# Altium footprint library devices.PCBLIB: 335 footprints (part 12 of 21)
Each footprint in its own frame and in the unit in brackets; x right, y up, seen from the top. Pads: shape width x height; smd on the part's side, far side on the other; paste and mask are expansions set on the pad; w line width, h text height; cw(c..) or ccw(c..) is an arc to the next point about the centre after c.
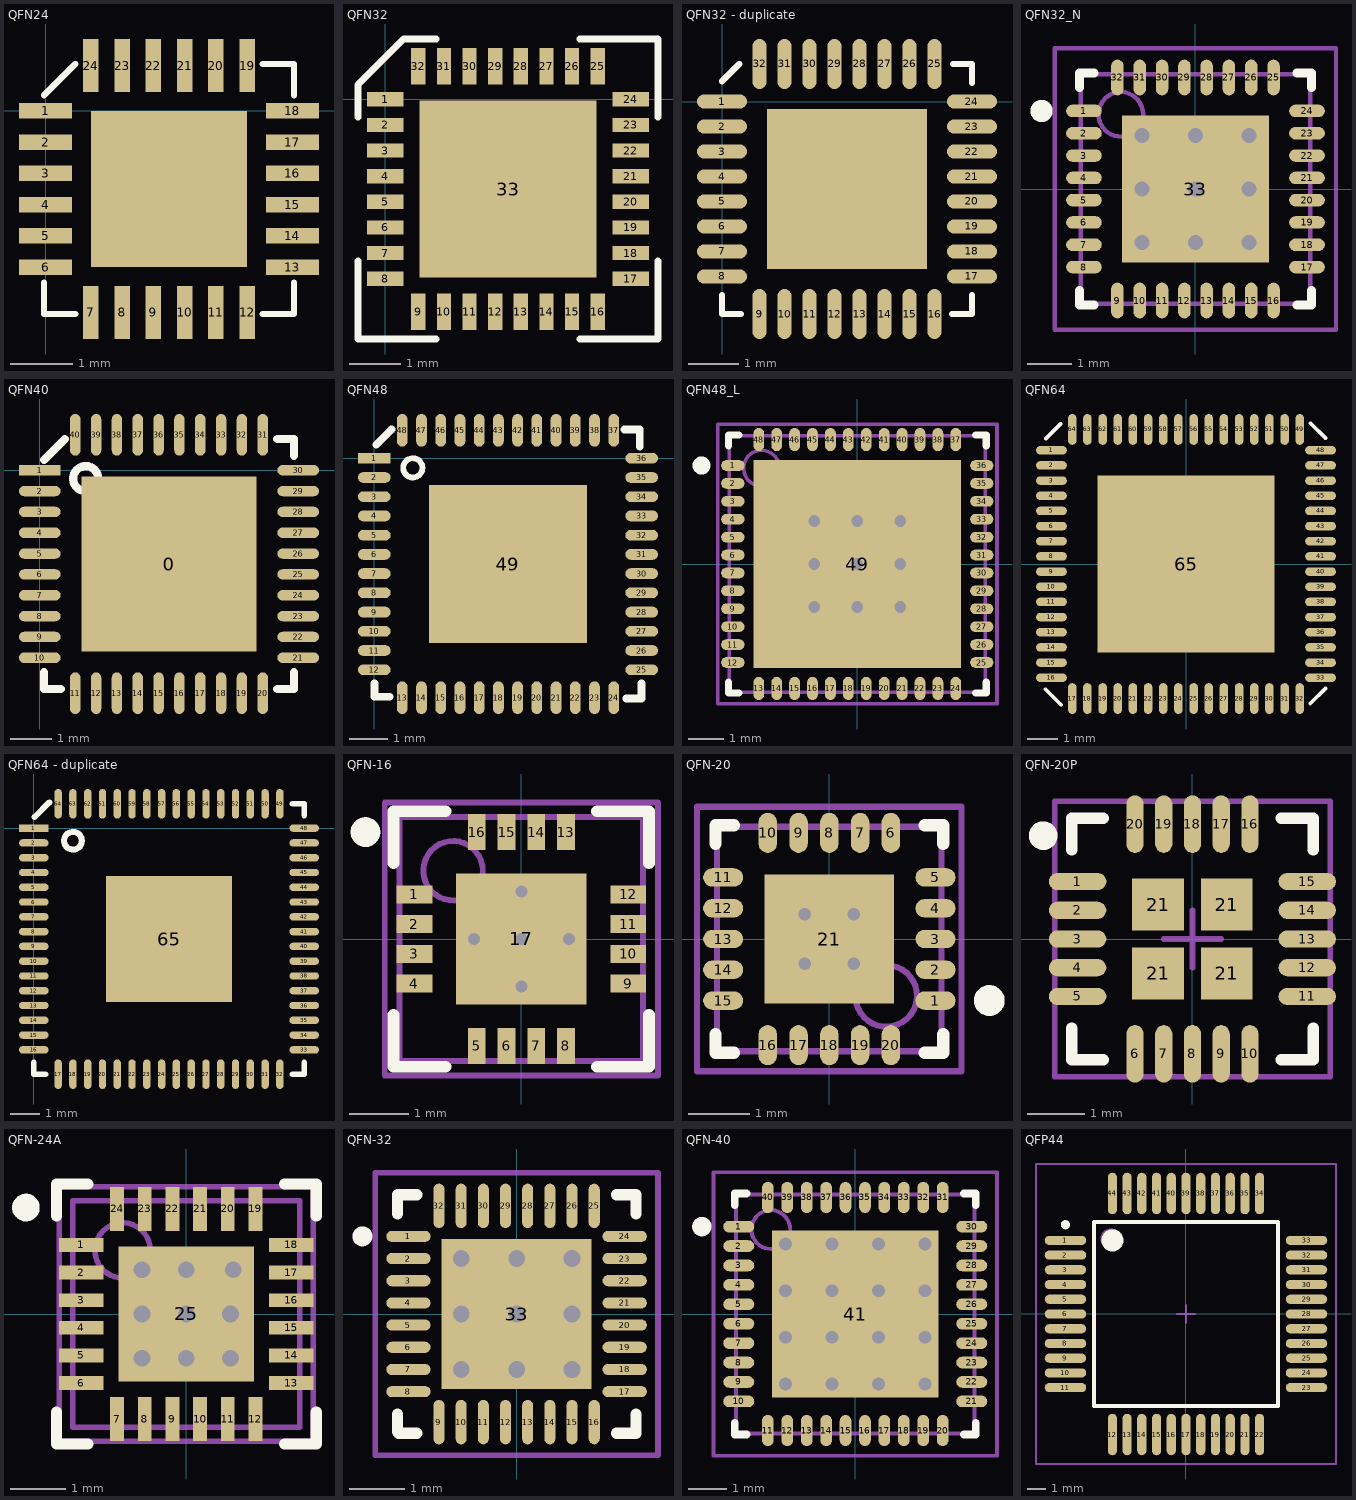
[diagram p11: the footprints below, top view; thin cyan lines are the x and y axes]

## QFN24 [mm]
pads (25):
  rect 0.85x0.25 smd: 1(0,0) 2(0,-0.5) 3(0,-1) 4(0,-1.5) 5(0,-2) 6(0,-2.5) 13(3.95,-2.5) 14(3.95,-2) 15(3.95,-1.5) 16(3.95,-1) 17(3.95,-0.5) 18(3.95,0)
  rect 0.25x0.85 smd: 7(0.725,-3.225) 8(1.225,-3.225) 9(1.725,-3.225) 10(2.225,-3.225) 11(2.725,-3.225) 12(3.225,-3.225) 19(3.225,0.725) 20(2.725,0.725) 21(2.225,0.725) 22(1.725,0.725) 23(1.225,0.725) 24(0.725,0.725)
  rect 2.5x2.5 smd: ""(1.975,-1.25)
Top Overlay:
  lines w0.1: -0.025,-2.75 -0.025,-3.25 0.475,-3.25 ; -0.025,0.25 0.475,0.75 ; 3.475,-3.25 3.975,-3.25 3.975,-2.75 ; 3.475,0.75 3.975,0.75 3.975,0.25

## QFN32 [mil]
pads (33):
  rect 28x11 smd: 1(0,0) 2(0,-19.7) 3(0,-39.4) 4(0,-59.1) 5(0,-78.8) 6(0,-98.5) 7(0,-118.2) 8(0,-137.9) 17(189,-137.9) 18(189,-118.2) 19(189,-98.5) 20(189,-78.8) 21(189,-59.1) 22(189,-39.4) 23(189,-19.7) 24(189,0)
  rect 11x28 smd: 9(25.55,-163.45) 10(45.25,-163.45) 11(64.95,-163.45) 12(84.65,-163.45) 13(104.35,-163.45) 14(124.05,-163.45) 15(143.75,-163.45) 16(163.45,-163.45) 25(163.45,25.55) 26(143.75,25.55) 27(124.05,25.55) 28(104.35,25.55) 29(84.65,25.55) 30(64.95,25.55) 31(45.25,25.55) 32(25.55,25.55)
  rect 136x136 smd: 33(94.5,-68.95)
Top Overlay:
  lines w5: -20.86,-124.31 -20.86,-184.31 39.14,-184.31 ; -20.86,-13.59 -20.86,11.41 14.14,46.41 39.14,46.41 ; 149.86,-184.31 209.86,-184.31 209.86,-124.31 ; 149.86,46.41 209.86,46.41 209.86,-13.59
Top Paste:
  lines w1: 31.5,-131.95 89.5,-131.95 89.5,-73.95 31.5,-73.95 31.5,-131.95 ; 31.5,-63.95 89.5,-63.95 89.5,-5.95 31.5,-5.95 31.5,-63.95 ; 99.5,-131.95 157.5,-131.95 157.5,-73.95 99.5,-73.95 99.5,-131.95 ; 99.5,-63.95 157.5,-63.95 157.5,-5.95 99.5,-5.95 99.5,-63.95

## QFN32 - duplicate [mm]
pads (33):
  oval 1x0.28 smd: 1(0,0) 2(0,-0.5) 3(0,-1) 4(0,-1.5) 5(0,-2) 6(0,-2.5) 7(0,-3) 8(0,-3.5) 17(5,-3.5) 18(5,-3) 19(5,-2.5) 20(5,-2) 21(5,-1.5) 22(5,-1) 23(5,-0.5) 24(5,0)
  oval 0.28x1 smd: 9(0.75,-4.25) 10(1.25,-4.25) 11(1.75,-4.25) 12(2.25,-4.25) 13(2.75,-4.25) 14(3.25,-4.25) 15(3.75,-4.25) 16(4.25,-4.25) 25(4.25,0.75) 26(3.75,0.75) 27(3.25,0.75) 28(2.75,0.75) 29(2.25,0.75) 30(1.75,0.75) 31(1.25,0.75) 32(0.75,0.75)
  rect 3.2x3.2 smd: ""(2.5,-1.75)
Top Overlay:
  lines w0.127: 0,-3.869 0,-4.25 0.381,-4.25 ; 0,0.404 0.346,0.75 ; 4.6,-4.25 5,-4.25 5,-3.869 ; 4.619,0.75 5,0.75 5,0.369

## QFN32_N [mm] "QFN, 32-Leads, Body 5x5mm, Pitch 0.5mm, IPC Medium Density"
height 0.8
pads (33):
  oval 0.8x0.28 smd: 1(-2.5,1.75) 2(-2.5,1.25) 3(-2.5,0.75) 4(-2.5,0.25) 5(-2.5,-0.25) 6(-2.5,-0.75) 7(-2.5,-1.25) 8(-2.5,-1.75) 17(2.5,-1.75) 18(2.5,-1.25) 19(2.5,-0.75) 20(2.5,-0.25) 21(2.5,0.25) 22(2.5,0.75) 23(2.5,1.25) 24(2.5,1.75)
  oval 0.28x0.8 smd: 9(-1.75,-2.5) 10(-1.25,-2.5) 11(-0.75,-2.5) 12(-0.25,-2.5) 13(0.25,-2.5) 14(0.75,-2.5) 15(1.25,-2.5) 16(1.75,-2.5) 25(1.75,2.5) 26(1.25,2.5) 27(0.75,2.5) 28(0.25,2.5) 29(-0.25,2.5) 30(-0.75,2.5) 31(-1.25,2.5) 32(-1.75,2.5)
  rect 3.3x3.3 smd: 33(0,0)
via 1.2,-1.2 diameter 0.66 hole 0.33
via 0,-1.2 diameter 0.66 hole 0.33
via -1.2,-1.2 diameter 0.66 hole 0.33
via 1.2,0 diameter 0.66 hole 0.33
via 0,0 diameter 0.66 hole 0.33
via -1.2,0 diameter 0.66 hole 0.33
via 1.2,1.2 diameter 0.66 hole 0.33
via 0,1.2 diameter 0.66 hole 0.33
via -1.2,1.2 diameter 0.66 hole 0.33
Top Overlay:
  circle w0.25: c-3.45,1.75 r0.125
  lines w0.2: -2.6,-2.275 -2.6,-2.6 -2.275,-2.6 ; -2.6,2.275 -2.6,2.6 -2.275,2.6 ; 2.275,-2.6 2.6,-2.6 2.6,-2.275 ; 2.275,2.6 2.6,2.6 2.6,2.275
Mechanical 13:
  circle w0.1: c-1.675,1.675 r0.5
  lines w0.1: -2.575,-2.575 2.575,-2.575 2.575,2.575 -2.575,2.575 -2.575,-2.575
Mechanical 15:
  lines w0.1: -0.5,0 0.5,0 ; 0,-0.5 0,0.5 ; -3.15,-3.15 3.15,-3.15 3.15,3.15 -3.15,3.15 -3.15,-3.15
3D body: height 0.8, standoff 0, extent -2.575,-2.575 2.575,2.575

## QFN40 [mm]
pads (41):
  rect 4.2x4.2 smd: 0(3.1,-2.25)
  rect 1x0.25 smd: 1(0,0)
  oval 1x0.25 smd: 2(0,-0.5) 3(0,-1) 4(0,-1.5) 5(0,-2) 6(0,-2.5) 7(0,-3) 8(0,-3.5) 9(0,-4) 10(0,-4.5) 21(6.2,-4.5) 22(6.2,-4) 23(6.2,-3.5) 24(6.2,-3) 25(6.2,-2.5) 26(6.2,-2) 27(6.2,-1.5) 28(6.2,-1) 29(6.2,-0.5) 30(6.2,0)
  oval 0.25x1 smd: 11(0.85,-5.35) 12(1.35,-5.35) 13(1.85,-5.35) 14(2.35,-5.35) 15(2.85,-5.35) 16(3.35,-5.35) 17(3.85,-5.35) 18(4.35,-5.35) 19(4.85,-5.35) 20(5.35,-5.35) 31(5.35,0.85) 32(4.85,0.85) 33(4.35,0.85) 34(3.85,0.85) 35(3.35,0.85) 36(2.85,0.85) 37(2.35,0.85) 38(1.85,0.85) 39(1.35,0.85) 40(0.85,0.85)
Top Overlay:
  circle w0.2: c1.1,-0.2 r0.3
  lines w0.2: 0.1,-4.85 0.1,-5.25 0.5,-5.25 ; 0.1,0.25 0.6,0.75 ; 5.7,-5.25 6.1,-5.25 6.1,-4.85 ; 5.7,0.75 6.1,0.75 6.1,0.35

## QFN48 [mm]
pads (75):
  rect 0x0 / inner round 0 / far side round 0 all layers, no hole: 1(-0.075,0) 2(-0.075,-0.5) 3(-0.075,-1) 4(-0.075,-1.5) 5(-0.075,-2) 6(-0.075,-2.5) 7(-0.075,-3) 8(-0.075,-3.5) 9(-0.075,-4) 10(-0.075,-4.5) 14(1.215,-6.29) 15(1.715,-6.29) 17(2.715,-6.29) 18(3.215,-6.29) 19(3.715,-6.29) 20(4.215,-6.29) 21(4.715,-6.29) 22(5.215,-6.29) 23(5.715,-6.29) 24(6.215,-6.29) 25(7.005,-5.5) 26(7.005,-5)
  rect 0.85x0.28 smd: 1(0,0)
  oval 0.85x0.28 smd: 2(0,-0.5) 3(0,-1) 4(0,-1.5) 5(0,-2) 6(0,-2.5) 7(0,-3) 8(0,-3.5) 9(0,-4) 10(0,-4.5) 11(0,-5) 12(0,-5.5) 25(6.95,-5.5) 26(6.95,-5) 27(6.95,-4.5) 28(6.95,-4) 29(6.95,-3.5) 30(6.95,-3) 31(6.95,-2.5) 32(6.95,-2) 33(6.95,-1.5) 34(6.95,-1) 35(6.95,-0.5) 36(6.95,0)
  round 0 all layers, no hole: 11(-0.075,-5) 12(-0.075,-5.5) 13(0.715,-6.29) 16(2.215,-6.29)
  oval 0.28x0.85 smd: 13(0.725,-6.225) 14(1.225,-6.225) 15(1.725,-6.225) 16(2.225,-6.225) 17(2.725,-6.225) 18(3.225,-6.225) 19(3.725,-6.225) 20(4.225,-6.225) 21(4.725,-6.225) 22(5.225,-6.225) 23(5.725,-6.225) 24(6.225,-6.225) 37(6.225,0.725) 38(5.725,0.725) 39(5.225,0.725) 40(4.725,0.725) 41(4.225,0.725) 42(3.725,0.725) 43(3.225,0.725) 44(2.725,0.725) 45(2.225,0.725) 46(1.725,0.725) 47(1.225,0.725) 48(0.725,0.725)
  rect 4.1x4.1 smd: 49(3.475,-2.75)
Top Overlay:
  circle w0.15: c1,-0.25 r0.25
  lines w0.203: 0,-5.85 0,-6.2 0.4,-6.2 ; 0.05,0.35 0.45,0.75 ; 6.5,0.75 6.9,0.75 6.9,0.3 ; 6.55,-6.25 6.95,-6.25 6.95,-5.85

## QFN48_L [mm] "QFN, 48-Leads, Body 7x7mm, Pitch 0.5mm, IPC High Density"
height 0.9
pads (49):
  oval 0.65x0.3 smd: 1(-3.475,2.75) 2(-3.475,2.25) 3(-3.475,1.75) 4(-3.475,1.25) 5(-3.475,0.75) 6(-3.475,0.25) 7(-3.475,-0.25) 8(-3.475,-0.75) 9(-3.475,-1.25) 10(-3.475,-1.75) 11(-3.475,-2.25) 12(-3.475,-2.75) 25(3.475,-2.75) 26(3.475,-2.25) 27(3.475,-1.75) 28(3.475,-1.25) 29(3.475,-0.75) 30(3.475,-0.25) 31(3.475,0.25) 32(3.475,0.75) 33(3.475,1.25) 34(3.475,1.75) 35(3.475,2.25) 36(3.475,2.75)
  oval 0.3x0.65 smd: 13(-2.75,-3.475) 14(-2.25,-3.475) 15(-1.75,-3.475) 16(-1.25,-3.475) 17(-0.75,-3.475) 18(-0.25,-3.475) 19(0.25,-3.475) 20(0.75,-3.475) 21(1.25,-3.475) 22(1.75,-3.475) 23(2.25,-3.475) 24(2.75,-3.475) 37(2.75,3.475) 38(2.25,3.475) 39(1.75,3.475) 40(1.25,3.475) 41(0.75,3.475) 42(0.25,3.475) 43(-0.25,3.475) 44(-0.75,3.475) 45(-1.25,3.475) 46(-1.75,3.475) 47(-2.25,3.475) 48(-2.75,3.475)
  rect 5.8x5.8 smd: 49(0,0)
via -1.2,1.2 diameter 0.66 hole 0.33
via 0,1.2 diameter 0.66 hole 0.33
via 1.2,1.2 diameter 0.66 hole 0.33
via -1.2,0 diameter 0.66 hole 0.33
via 0,0 diameter 0.66 hole 0.33
via 1.2,0 diameter 0.66 hole 0.33
via -1.2,-1.2 diameter 0.66 hole 0.33
via 0,-1.2 diameter 0.66 hole 0.33
via 1.2,-1.2 diameter 0.66 hole 0.33
Top Overlay:
  circle w0.25: c-4.35,2.75 r0.125
  lines w0.2: -3.6,-3.3 -3.6,-3.6 -3.3,-3.6 ; -3.6,3.3 -3.6,3.6 -3.3,3.6 ; 3.3,-3.6 3.6,-3.6 3.6,-3.3 ; 3.3,3.6 3.6,3.6 3.6,3.3
Mechanical 13:
  circle w0.1: c-2.675,2.675 r0.5
  lines w0.1: -3.575,-3.575 -3.575,3.575 3.575,3.575 3.575,-3.575 -3.575,-3.575
Mechanical 15:
  lines w0.1: -0.5,0 0.5,0 ; 0,-0.5 0,0.5 ; -3.9,-3.9 -3.9,3.9 3.9,3.9 3.9,-3.9 -3.9,-3.9
3D body: height 0.9, standoff 0, extent -3.575,-3.575 3.575,3.575

## QFN64 [mil]
pads (65):
  oval 40x11 smd: 1(-174.72,147.64) 2(-174.72,127.95) 3(-174.72,108.27) 4(-174.72,88.58) 5(-174.72,68.9) 6(-174.72,49.21) 7(-174.72,29.53) 8(-174.72,9.84) 9(-174.72,-9.84) 10(-174.72,-29.53) 11(-174.72,-49.21) 12(-174.72,-68.9) 13(-174.72,-88.58) 14(-174.72,-108.27) 15(-174.72,-127.95) 16(-174.72,-147.64) 33(174.72,-147.64) 34(174.72,-127.95) 35(174.72,-108.27) 36(174.72,-88.58) 37(174.72,-68.9) 38(174.72,-49.21) 39(174.72,-29.53) 40(174.72,-9.84) 41(174.72,9.84) 42(174.72,29.53) 43(174.72,49.21) 44(174.72,68.9) 45(174.72,88.58) 46(174.72,108.27) 47(174.72,127.95) 48(174.72,147.64)
  oval 11x40 smd: 17(-147.64,-174.72) 18(-127.95,-174.72) 19(-108.27,-174.72) 20(-88.58,-174.72) 21(-68.9,-174.72) 22(-49.21,-174.72) 23(-29.53,-174.72) 24(-9.84,-174.72) 25(9.84,-174.72) 26(29.53,-174.72) 27(49.21,-174.72) 28(68.9,-174.72) 29(88.58,-174.72) 30(108.27,-174.72) 31(127.95,-174.72) 32(147.64,-174.72) 49(147.64,174.72) 50(127.95,174.72) 51(108.27,174.72) 52(88.58,174.72) 53(68.9,174.72) 54(49.21,174.72) 55(29.53,174.72) 56(9.84,174.72) 57(-9.84,174.72) 58(-29.53,174.72) 59(-49.21,174.72) 60(-68.9,174.72) 61(-88.58,174.72) 62(-108.27,174.72) 63(-127.95,174.72) 64(-147.64,174.72)
  rect 230x230 smd: 65(0,0)
Top Overlay:
  lines w5: -182.28,-162.6 -162.2,-182.68 ; -181.89,162.99 -162.99,181.89 ; 161.22,-181.3 181.1,-161.42 ; 161.81,182.68 180.91,163.58
Top Paste:
  pour cut-out: -106.69,107.87 -106.69,6.3 -14.17,6.3 -14.17,107.87
  pour cut-out: 13.78,107.87 13.78,6.3 106.3,6.3 106.3,107.87
  pour cut-out: 14.17,-5.91 14.17,-107.48 106.69,-107.48 106.69,-5.91
  pour cut-out: -106.69,-5.91 -106.69,-107.48 -14.17,-107.48 -14.17,-5.91

## QFN64 - duplicate [mm]
pads (65):
  rect 1x0.25 smd: 1(0,0)
  oval 1x0.25 smd: 2(0,-0.5) 3(0,-1) 4(0,-1.5) 5(0,-2) 6(0,-2.5) 7(0,-3) 8(0,-3.5) 9(0,-4) 10(0,-4.5) 11(0,-5) 12(0,-5.5) 13(0,-6) 14(0,-6.5) 15(0,-7) 16(0,-7.5) 33(9.15,-7.5) 34(9.15,-7) 35(9.15,-6.5) 36(9.15,-6) 37(9.15,-5.5) 38(9.15,-5) 39(9.15,-4.5) 40(9.15,-4) 41(9.15,-3.5) 42(9.15,-3) 43(9.15,-2.5) 44(9.15,-2) 45(9.15,-1.5) 46(9.15,-1) 47(9.15,-0.5) 48(9.15,0)
  oval 0.25x1 smd: 17(0.825,-8.325) 18(1.325,-8.325) 19(1.825,-8.325) 20(2.325,-8.325) 21(2.825,-8.325) 22(3.325,-8.325) 23(3.825,-8.325) 24(4.325,-8.325) 25(4.825,-8.325) 26(5.325,-8.325) 27(5.825,-8.325) 28(6.325,-8.325) 29(6.825,-8.325) 30(7.325,-8.325) 31(7.825,-8.325) 32(8.325,-8.325) 49(8.325,0.825) 50(7.825,0.825) 51(7.325,0.825) 52(6.825,0.825) 53(6.325,0.825) 54(5.825,0.825) 55(5.325,0.825) 56(4.825,0.825) 57(4.325,0.825) 58(3.825,0.825) 59(3.325,0.825) 60(2.825,0.825) 61(2.325,0.825) 62(1.825,0.825) 63(1.325,0.825) 64(0.825,0.825)
  rect 4.25x4.25 smd: 65(4.575,-3.75)
Top Overlay:
  circle w0.2: c1.325,-0.425 r0.3
  lines w0.2: 0,-7.925 0,-8.325 0.4,-8.325 ; 8.75,-8.325 9.15,-8.325 9.15,-7.925 ; 8.75,0.825 9.15,0.825 9.15,0.425
  lines w0.203: 0.025,0.375 0.525,0.875

## QFN-16 [mm] "QFN, 16-Leads, Body 4x4mm, Pitch 0.5mm, NSC Recommended"
height 0.8
pads (17):
  rect 0.6x0.3 smd paste-0.125 mask+0.051: 1(-1.8,0.75) 2(-1.8,0.25) 3(-1.8,-0.25) 4(-1.8,-0.75) 9(1.8,-0.75) 10(1.8,-0.25) 11(1.8,0.25) 12(1.8,0.75)
  rect 0.3x0.6 smd paste-0.125 mask+0.051: 5(-0.75,-1.8) 6(-0.25,-1.8) 7(0.25,-1.8) 8(0.75,-1.8) 13(0.75,1.8) 14(0.25,1.8) 15(-0.25,1.8) 16(-0.75,1.8)
  rect 2.2x2.2 smd paste-1.3 mask+0.051: 17(0,0)
via 0,-0.8 diameter 0.5 hole 0.2
via 0,0.8 diameter 0.5 hole 0.2
via -0.8,0 diameter 0.5 hole 0.2
via 0.8,0 diameter 0.5 hole 0.2
via 0,0 diameter 0.5 hole 0.2
Top Overlay:
  circle w0.25: c-2.625,1.8 r0.125
  lines w0.2: -2.15,-1.275 -2.15,-2.15 -1.275,-2.15 ; -2.15,1.275 -2.15,2.15 -1.275,2.15 ; 1.275,-2.15 2.15,-2.15 2.15,-1.275 ; 1.275,2.15 2.15,2.15 2.15,1.275
Top Paste:
  rectangle: 0.1,-1.2 1.2,-0.1
  region: -0.1,-0.1 -1.2,-0.1 -1.2,-1.2 -0.1,-1.2
  region: -0.1,1.2 -1.2,1.2 -1.2,0.1 -0.1,0.1
  rectangle: 0.1,0.1 1.2,1.2
  rectangle: -2.3,0.625 -1.6,0.875
  rectangle: -2.3,0.125 -1.6,0.375
  rectangle: -2.3,-0.375 -1.6,-0.125
  rectangle: -2.3,-0.875 -1.6,-0.625
  region: 2.3,0.875 1.6,0.875 1.6,0.625 2.3,0.625
  region: 2.3,0.375 1.6,0.375 1.6,0.125 2.3,0.125
  region: 2.3,-0.125 1.6,-0.125 1.6,-0.375 2.3,-0.375
  region: 2.3,-0.625 1.6,-0.625 1.6,-0.875 2.3,-0.875
  region: -0.875,2.3 -0.875,1.6 -0.625,1.6 -0.625,2.3
  region: -0.375,2.3 -0.375,1.6 -0.125,1.6 -0.125,2.3
  region: 0.125,2.3 0.125,1.6 0.375,1.6 0.375,2.3
  region: 0.625,2.3 0.625,1.6 0.875,1.6 0.875,2.3
  region: 0.875,-2.3 0.875,-1.6 0.625,-1.6 0.625,-2.3
  region: 0.375,-2.3 0.375,-1.6 0.125,-1.6 0.125,-2.3
  region: -0.125,-2.3 -0.125,-1.6 -0.375,-1.6 -0.375,-2.3
  region: -0.625,-2.3 -0.625,-1.6 -0.875,-1.6 -0.875,-2.3
Mechanical 13:
  circle w0.1: c-1.15,1.15 r0.5
  lines w0.1: -2.05,-2.05 -2.05,2.05 2.05,2.05 2.05,-2.05 -2.05,-2.05
Mechanical 15:
  lines w0.1: -0.5,0 0.5,0 ; 0,-0.5 0,0.5 ; -2.3,-2.3 -2.3,2.3 2.3,2.3 2.3,-2.3 -2.3,-2.3
3D body: height 0.8, standoff 0, extent -2.05,-2.05 2.05,2.05

## QFN-20 [mm] "QFN, 20-Leads, Body 3.5x3.5mm, Pitch 0.5mm, IPC High Density"
height 1
pads (21):
  oval 0.65x0.3 smd: 1(1.725,-1) 2(1.725,-0.5) 3(1.725,0) 4(1.725,0.5) 5(1.725,1) 11(-1.725,1) 12(-1.725,0.5) 13(-1.725,0) 14(-1.725,-0.5) 15(-1.725,-1)
  oval 0.3x0.65 smd: 6(1,1.725) 7(0.5,1.725) 8(0,1.725) 9(-0.5,1.725) 10(-1,1.725) 16(-1,-1.725) 17(-0.5,-1.725) 18(0,-1.725) 19(0.5,-1.725) 20(1,-1.725)
  rect 2.1x2.1 smd: 21(0,0)
via -0.4,0.4 diameter 0.508 hole 0.203
via 0.4,0.4 diameter 0.508 hole 0.203
via -0.4,-0.4 diameter 0.508 hole 0.203
via 0.4,-0.4 diameter 0.508 hole 0.203
Top Overlay:
  circle w0.25: c2.6,-1 r0.125
  lines w0.2: -1.85,-1.55 -1.85,-1.85 -1.55,-1.85 ; -1.85,1.55 -1.85,1.85 -1.55,1.85 ; 1.55,-1.85 1.85,-1.85 1.85,-1.55 ; 1.55,1.85 1.85,1.85 1.85,1.55
Mechanical 13:
  circle w0.1: c0.925,-0.925 r0.5
  lines w0.1: -1.825,-1.825 1.825,-1.825 1.825,1.825 -1.825,1.825 -1.825,-1.825
Mechanical 15:
  lines w0.1: -0.5,0 0.5,0 ; 0,-0.5 0,0.5 ; -2.15,-2.15 2.15,-2.15 2.15,2.15 -2.15,2.15 -2.15,-2.15
3D body: height 1, standoff 0, extent -1.825,-1.825 1.825,1.825

## QFN-20P [mm]
height 1
pads (24):
  oval 1x0.3 smd: 1(-2,1) 2(-2,0.5) 3(-2,0) 4(-2,-0.5) 5(-2,-1) 11(2,-1) 12(2,-0.5) 13(2,0) 14(2,0.5) 15(2,1)
  oval 0.3x1 smd: 6(-1,-2) 7(-0.5,-2) 8(0,-2) 9(0.5,-2) 10(1,-2) 16(1,2) 17(0.5,2) 18(0,2) 19(-0.5,2) 20(-1,2)
  rect 0.9x0.9 smd: 21(-0.6,-0.6) 21(-0.6,0.6) 21(0.6,-0.6) 21(0.6,0.6)
Top Overlay:
  circle w0.25: c-2.6,1.8 r0.125
  lines w0.2: -2.1,-1.55 -2.1,-2.1 -1.55,-2.1 ; -2.1,1.55 -2.1,2.1 -1.55,2.1 ; 1.55,-2.1 2.1,-2.1 2.1,-1.55 ; 1.55,2.1 2.1,2.1 2.1,1.55
Mechanical 15:
  lines w0.1: -0.5,0 0.5,0 ; 0,-0.5 0,0.5 ; -2.4,-2.4 2.4,-2.4 2.4,2.4 -2.4,2.4 -2.4,-2.4

## QFN-24A [mm] "QFN, 24-Leads, Body 4x4mm, Pitch 0.5mm, NSC Recommended"
height 0.8
pads (25):
  rect 0.8x0.25 smd paste-0.125 mask+0.051: 1(-1.9,1.25) 2(-1.9,0.75) 3(-1.9,0.25) 4(-1.9,-0.25) 5(-1.9,-0.75) 6(-1.9,-1.25) 13(1.9,-1.25) 14(1.9,-0.75) 15(1.9,-0.25) 16(1.9,0.25) 17(1.9,0.75) 18(1.9,1.25)
  rect 0.25x0.8 smd paste-0.125 mask+0.051: 7(-1.25,-1.9) 8(-0.75,-1.9) 9(-0.25,-1.9) 10(0.25,-1.9) 11(0.75,-1.9) 12(1.25,-1.9) 19(1.25,1.9) 20(0.75,1.9) 21(0.25,1.9) 22(-0.25,1.9) 23(-0.75,1.9) 24(-1.25,1.9)
  rect 2.45x2.45 smd paste-1.3 mask+0.051: 25(0,0)
via -0.8,0.8 diameter 0.5 hole 0.3
via 0,0.8 diameter 0.5 hole 0.3
via 0.85,0.8 diameter 0.5 hole 0.3
via -0.8,0 diameter 0.5 hole 0.3
via 0,0 diameter 0.5 hole 0.3
via 0.8,0 diameter 0.5 hole 0.3
via -0.8,-0.8 diameter 0.5 hole 0.3
via 0,-0.8 diameter 0.5 hole 0.3
via 0.8,-0.8 diameter 0.5 hole 0.3
Top Overlay:
  circle w0.25: c-2.9,1.925 r0.125
  lines w0.2: -2.35,-1.775 -2.35,-2.35 -1.775,-2.35 ; -2.35,1.775 -2.35,2.35 -1.775,2.35 ; 1.775,-2.35 2.35,-2.35 2.35,-1.775 ; 1.775,2.35 2.35,2.35 2.35,1.775
Top Paste:
  rectangle: 0.1,0.1 1.2,1.2
  region: -0.1,1.2 -1.2,1.2 -1.2,0.1 -0.1,0.1
  region: -0.1,-0.1 -1.2,-0.1 -1.2,-1.2 -0.1,-1.2
  rectangle: 0.1,-1.2 1.2,-0.1
  rectangle: -2.4,1.125 -1.7,1.375
  rectangle: -2.4,0.625 -1.7,0.875
  rectangle: -2.4,0.125 -1.7,0.375
  rectangle: -2.4,-0.375 -1.7,-0.125
  rectangle: -2.4,-0.875 -1.7,-0.625
  rectangle: -2.4,-1.375 -1.7,-1.125
  region: 1.375,-2.4 1.375,-1.7 1.125,-1.7 1.125,-2.4
  region: 0.875,-2.4 0.875,-1.7 0.625,-1.7 0.625,-2.4
  region: 0.375,-2.4 0.375,-1.7 0.125,-1.7 0.125,-2.4
  region: -0.125,-2.4 -0.125,-1.7 -0.375,-1.7 -0.375,-2.4
  region: -0.625,-2.4 -0.625,-1.7 -0.875,-1.7 -0.875,-2.4
  region: -1.125,-2.4 -1.125,-1.7 -1.375,-1.7 -1.375,-2.4
  region: 2.4,1.375 1.7,1.375 1.7,1.125 2.4,1.125
  region: 2.4,0.875 1.7,0.875 1.7,0.625 2.4,0.625
  region: 2.4,0.375 1.7,0.375 1.7,0.125 2.4,0.125
  region: 2.4,-0.125 1.7,-0.125 1.7,-0.375 2.4,-0.375
  region: 2.4,-0.625 1.7,-0.625 1.7,-0.875 2.4,-0.875
  region: 2.4,-1.125 1.7,-1.125 1.7,-1.375 2.4,-1.375
  region: -1.375,2.4 -1.375,1.7 -1.125,1.7 -1.125,2.4
  region: -0.875,2.4 -0.875,1.7 -0.625,1.7 -0.625,2.4
  region: -0.375,2.4 -0.375,1.7 -0.125,1.7 -0.125,2.4
  region: 0.125,2.4 0.125,1.7 0.375,1.7 0.375,2.4
  region: 0.625,2.4 0.625,1.7 0.875,1.7 0.875,2.4
  region: 1.125,2.4 1.125,1.7 1.375,1.7 1.375,2.4
Mechanical 13:
  circle w0.1: c-1.15,1.15 r0.5
  lines w0.1: -2.05,-2.05 2.05,-2.05 2.05,2.05 -2.05,2.05 -2.05,-2.05
Mechanical 15:
  lines w0.1: -0.5,0 0.5,0 ; 0,-0.5 0,0.5 ; -2.3,-2.3 2.3,-2.3 2.3,2.3 -2.3,2.3 -2.3,-2.3
3D body: height 0.8, standoff 0, extent -2.05,-2.05 2.05,2.05

## QFN-32 [mm] "QFN, 32-Leads, Body 5x5mm, Pitch 0.5mm, IPC High Density"
height 1
pads (33):
  oval 0.8x0.2 smd: 1(-1.95,1.4) 2(-1.95,1) 3(-1.95,0.6) 4(-1.95,0.2) 5(-1.95,-0.2) 6(-1.95,-0.6) 7(-1.95,-1) 8(-1.95,-1.4) 17(1.95,-1.4) 18(1.95,-1) 19(1.95,-0.6) 20(1.95,-0.2) 21(1.95,0.2) 22(1.95,0.6) 23(1.95,1) 24(1.95,1.4)
  oval 0.2x0.8 smd: 9(-1.4,-1.95) 10(-1,-1.95) 11(-0.6,-1.95) 12(-0.2,-1.95) 13(0.2,-1.95) 14(0.6,-1.95) 15(1,-1.95) 16(1.4,-1.95) 25(1.4,1.95) 26(1,1.95) 27(0.6,1.95) 28(0.2,1.95) 29(-0.2,1.95) 30(-0.6,1.95) 31(-1,1.95) 32(-1.4,1.95)
  rect 2.7x2.7 smd: 33(0,0)
via 0,1 diameter 0.5 hole 0.3
via 1,1 diameter 0.5 hole 0.3
via -1,0 diameter 0.5 hole 0.3
via -1,-1 diameter 0.5 hole 0.3
via 1,0 diameter 0.5 hole 0.3
via 0,-1 diameter 0.5 hole 0.3
via 1,-1 diameter 0.5 hole 0.3
via -1,1 diameter 0.5 hole 0.3
via 0,0 diameter 0.5 hole 0.3
Top Overlay:
  circle w0.2: c-2.78,1.4 r0.08
  lines w0.2: -2.15,-2.125 -2.15,-1.8 ; -2.15,1.8 -2.15,2.15 ; -2.125,-2.15 -1.8,-2.15 ; -2.125,2.15 -1.8,2.15 ; 1.8,-2.15 2.15,-2.15 2.15,-1.8 ; 1.8,2.15 2.125,2.15 ; 2.15,1.8 2.15,2.15
Mechanical 15:
  lines w0.1: -0.15,-0.5 0.85,-0.5 ; 0.35,-1 0.35,0 ; -2.55,-2.55 2.55,-2.55 2.55,2.55 -2.55,2.55 -2.55,-2.55

## QFN-40 [mm] "QFN, 40-Leads, Body 6x6mm, Pitch 0.5mm, IPC Medium Density"
height 0.8
pads (41):
  oval 0.8x0.3 smd: 1(-3,2.25) 2(-3,1.75) 3(-3,1.25) 4(-3,0.75) 5(-3,0.25) 6(-3,-0.25) 7(-3,-0.75) 8(-3,-1.25) 9(-3,-1.75) 10(-3,-2.25) 21(3,-2.25) 22(3,-1.75) 23(3,-1.25) 24(3,-0.75) 25(3,-0.25) 26(3,0.25) 27(3,0.75) 28(3,1.25) 29(3,1.75) 30(3,2.25)
  oval 0.3x0.8 smd: 11(-2.25,-3) 12(-1.75,-3) 13(-1.25,-3) 14(-0.75,-3) 15(-0.25,-3) 16(0.25,-3) 17(0.75,-3) 18(1.25,-3) 19(1.75,-3) 20(2.25,-3) 31(2.25,3) 32(1.75,3) 33(1.25,3) 34(0.75,3) 35(0.25,3) 36(-0.25,3) 37(-0.75,3) 38(-1.25,3) 39(-1.75,3) 40(-2.25,3)
  rect 4.3x4.3 smd: 41(0,0)
via 1.8,-1.8 diameter 0.66 hole 0.33
via 0.6,-1.8 diameter 0.66 hole 0.33
via -0.6,-1.8 diameter 0.66 hole 0.33
via -1.8,-1.8 diameter 0.66 hole 0.33
via 1.8,-0.6 diameter 0.66 hole 0.33
via 0.6,-0.6 diameter 0.66 hole 0.33
via -0.6,-0.6 diameter 0.66 hole 0.33
via -1.8,-0.6 diameter 0.66 hole 0.33
via 1.8,0.6 diameter 0.66 hole 0.33
via 0.6,0.6 diameter 0.66 hole 0.33
via -0.6,0.6 diameter 0.66 hole 0.33
via -1.8,0.6 diameter 0.66 hole 0.33
via 1.8,1.8 diameter 0.66 hole 0.33
via 0.6,1.8 diameter 0.66 hole 0.33
via -0.6,1.8 diameter 0.66 hole 0.33
via -1.8,1.8 diameter 0.66 hole 0.33
Top Overlay:
  circle w0.25: c-3.95,2.25 r0.125
  lines w0.2: -3.1,-2.8 -3.1,-3.1 -2.8,-3.1 ; -3.1,2.8 -3.1,3.1 -2.8,3.1 ; 2.8,-3.1 3.1,-3.1 3.1,-2.8 ; 2.8,3.1 3.1,3.1 3.1,2.8
Mechanical 13:
  circle w0.1: c-2.175,2.175 r0.5
  lines w0.1: -3.075,-3.075 3.075,-3.075 3.075,3.075 -3.075,3.075 -3.075,-3.075
Mechanical 15:
  lines w0.1: -0.5,0 0.5,0 ; 0,-0.5 0,0.5 ; -3.65,-3.65 3.65,-3.65 3.65,3.65 -3.65,3.65 -3.65,-3.65
3D body: height 0.8, standoff 0, extent -3.075,-3.075 3.075,3.075

## QFP44 [mm] "QFP, 44-Leads, Body 10x10mm, Pitch 0.8mm, IPC Low Density"
height 2.45
pads (44):
  oval 2.25x0.5 smd: 1(-6.55,4) 2(-6.55,3.2) 3(-6.55,2.4) 4(-6.55,1.6) 5(-6.55,0.8) 6(-6.55,0) 7(-6.55,-0.8) 8(-6.55,-1.6) 9(-6.55,-2.4) 10(-6.55,-3.2) 11(-6.55,-4) 23(6.55,-4) 24(6.55,-3.2) 25(6.55,-2.4) 26(6.55,-1.6) 27(6.55,-0.8) 28(6.55,0) 29(6.55,0.8) 30(6.55,1.6) 31(6.55,2.4) 32(6.55,3.2) 33(6.55,4)
  oval 0.5x2.25 smd: 12(-4,-6.55) 13(-3.2,-6.55) 14(-2.4,-6.55) 15(-1.6,-6.55) 16(-0.8,-6.55) 17(0,-6.55) 18(0.8,-6.55) 19(1.6,-6.55) 20(2.4,-6.55) 21(3.2,-6.55) 22(4,-6.55) 34(4,6.55) 35(3.2,6.55) 36(2.4,6.55) 37(1.6,6.55) 38(0.8,6.55) 39(0,6.55) 40(-0.8,6.55) 41(-1.6,6.55) 42(-2.4,6.55) 43(-3.2,6.55) 44(-4,6.55)
Top Overlay:
  circle w0.6: c-4,4 r0.3
  circle w0.25: c-6.55,4.85 r0.125
  lines w0.2: -5,-5 5,-5 5,5 -5,5 -5,-5
Mechanical 13:
  circle w0.1: c-4.1,4.1 r0.5
  lines w0.1: -5,-5 5,-5 5,5 -5,5 -5,-5
Mechanical 15:
  lines w0.1: -0.5,0 0.5,0 ; 0,-0.5 0,0.5 ; -8.15,-8.15 8.15,-8.15 8.15,8.15 -8.15,8.15 -8.15,-8.15
3D body: height 2.45, standoff 0, extent -5,-5 5,5